# Altium schematic symbol library 13-Analog D 数模模数.SchLib: 573 symbols (part 6 of 6) (continued)
## TPS-1 (continued)
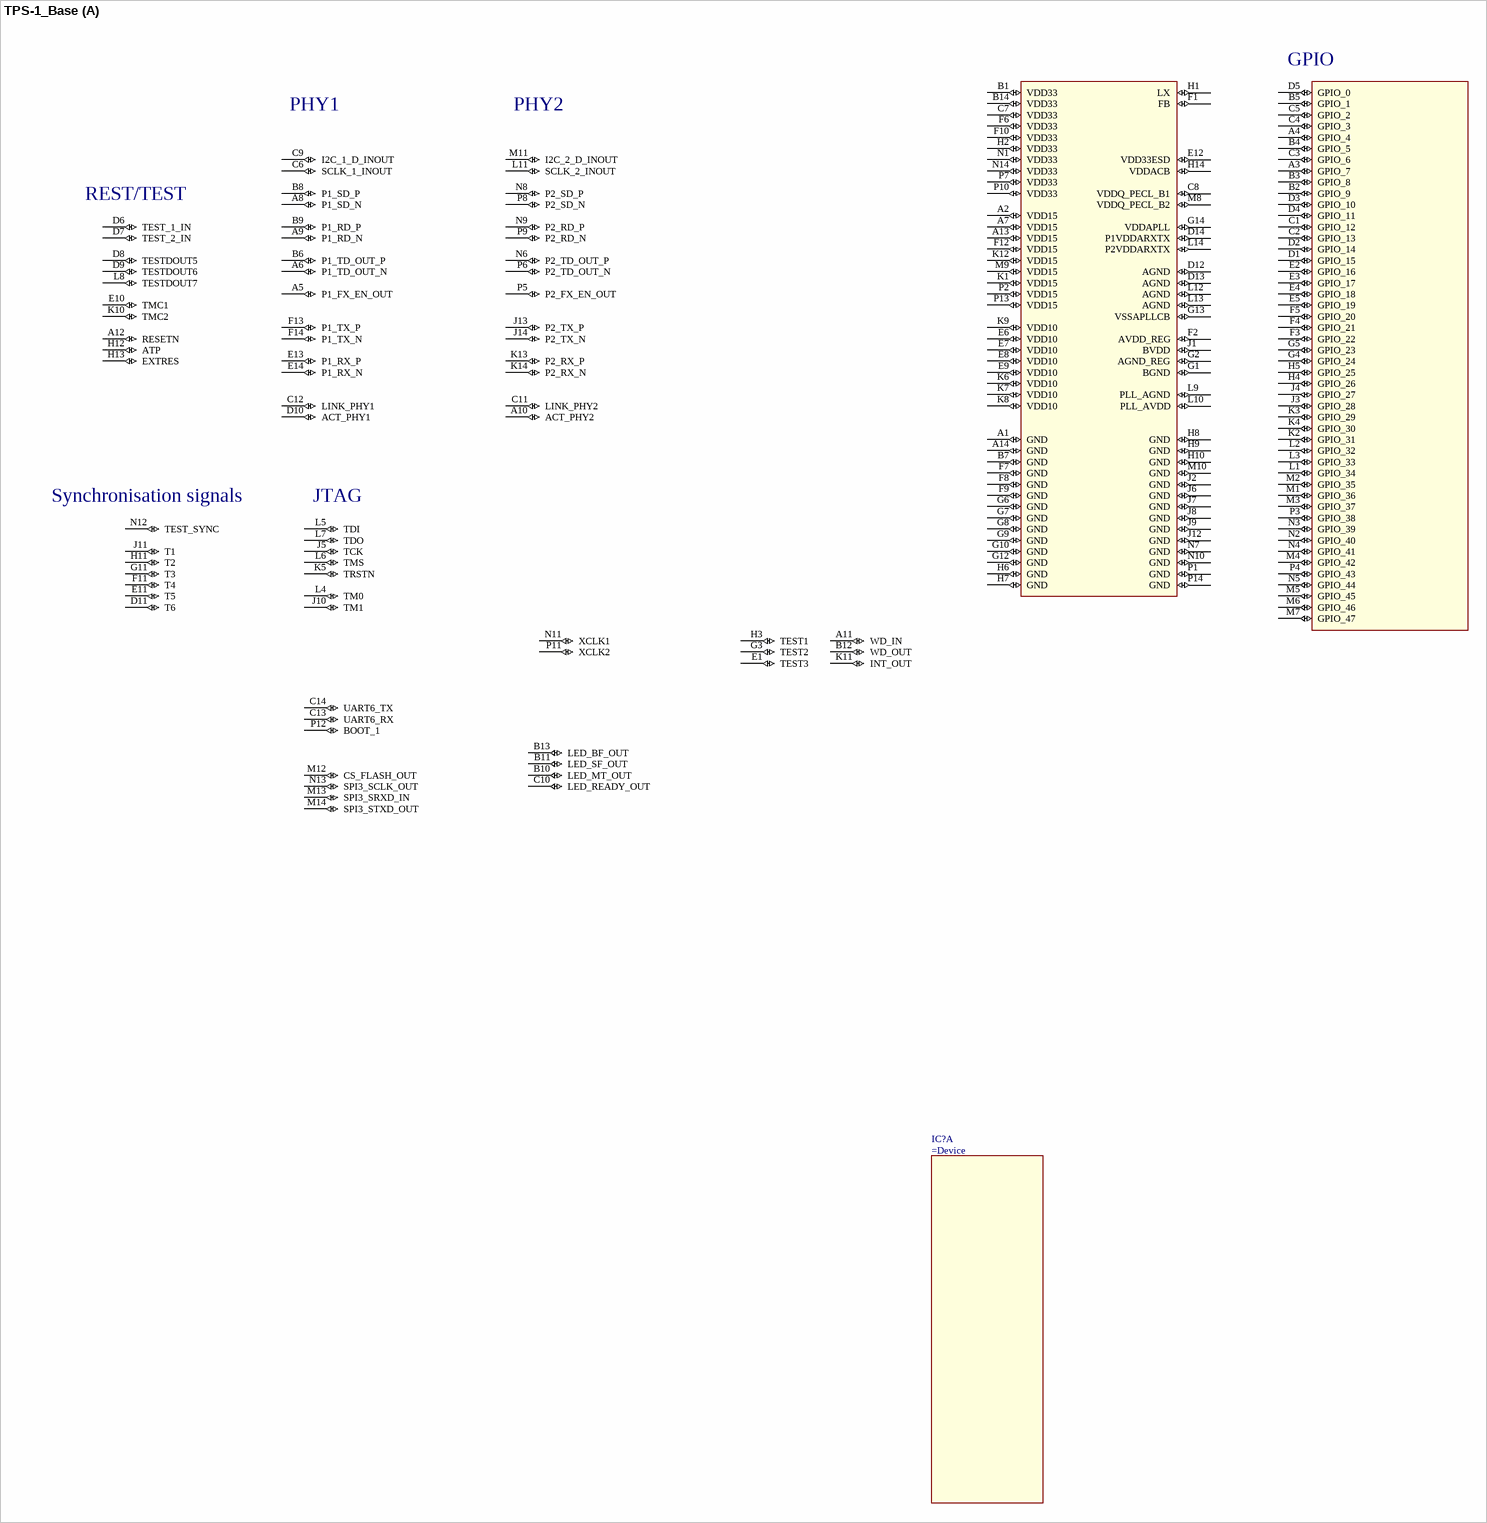
[diagram p38: symbol TPS-1_Base]

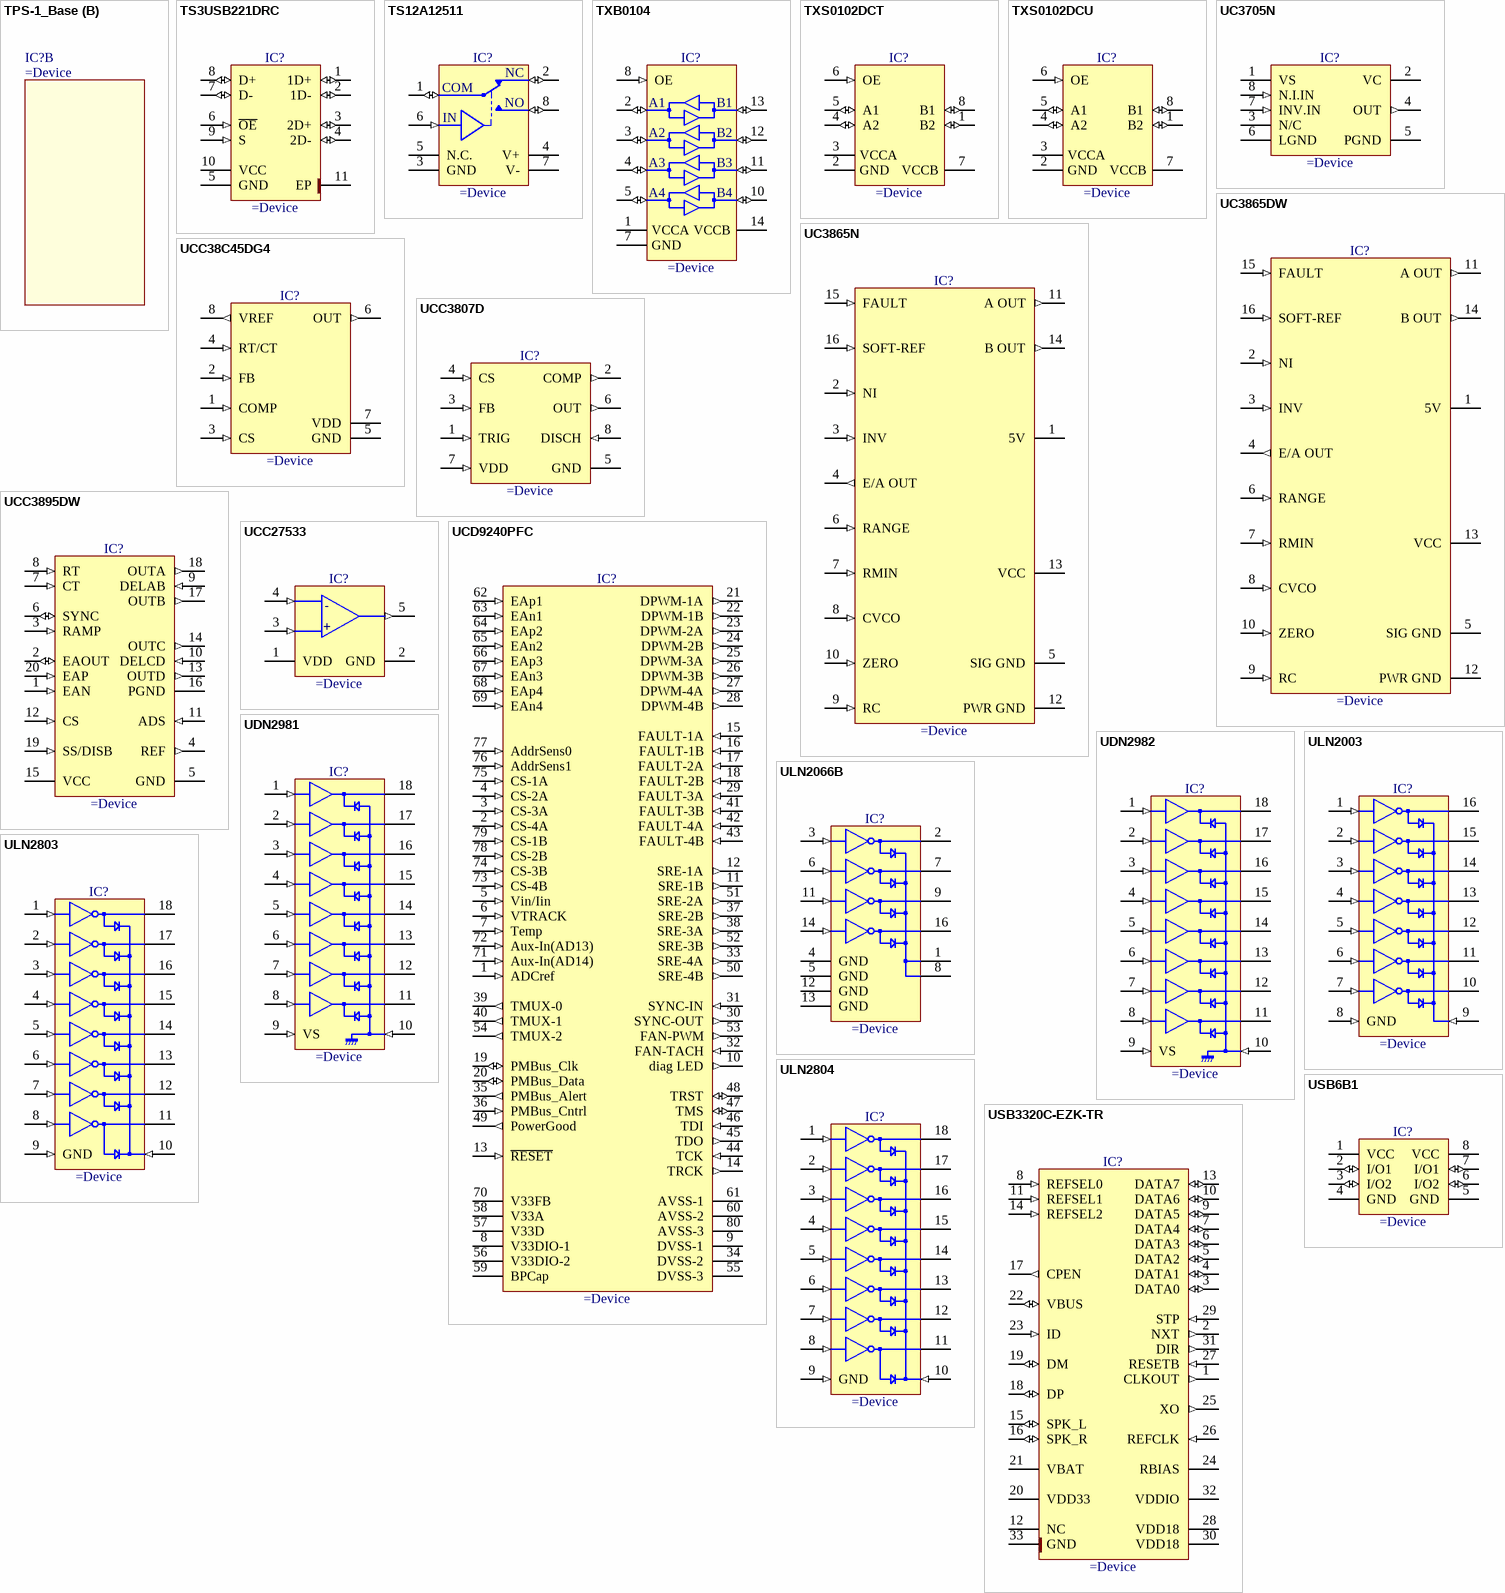
[diagram p39: symbols TPS-1_Base to USB3320C-EZK-TR]

## TPS-1_Base
designator IC?
Single Chip Interface Solution for PROFINET IO Devices
part A pins: A1 GND (io), A2 VDD15 (io), A3 GPIO_7 (io), A4 GPIO_4 (io), A5 P1_FX_EN_OUT (io), A6 P1_TD_OUT_N (io), A7 VDD15 (io), A8 P1_SD_N (io), A9 P1_RD_N (io), A10 ACT_PHY2 (io), A11 WD_IN (io), A12 RESETN (io), A13 VDD15 (io), A14 GND (io), B1 VDD33 (io), B2 GPIO_9 (io), B3 GPIO_8 (io), B4 GPIO_5 (io), B5 GPIO_1 (io), B6 P1_TD_OUT_P (io), B7 GND (io), B8 P1_SD_P (io), B9 P1_RD_P (io), B10 LED_MT_OUT (io), B11 LED_SF_OUT (io), B12 WD_OUT (io), B13 LED_BF_OUT (io), B14 VDD33 (io), C1 GPIO_12 (io), C2 GPIO_13 (io), C3 GPIO_6 (io), C4 GPIO_3 (io), C5 GPIO_2 (io), C6 SCLK_1_INOUT (io), C7 VDD33 (io), C8 VDDQ_PECL_B1 (io), C9 I2C_1_D_INOUT (io), C10 LED_READY_OUT (io), C11 LINK_PHY2 (io), C12 LINK_PHY1 (io), C13 UART6_RX (io), C14 UART6_TX (io), D1 GPIO_15 (io), D2 GPIO_14 (io), D3 GPIO_10 (io), D4 GPIO_11 (io), D5 GPIO_0 (io), D6 TEST_1_IN (io), D7 TEST_2_IN (io), D8 TESTDOUT5 (io), D9 TESTDOUT6 (io), D10 ACT_PHY1 (io), D11 T6 (io), D12 AGND (io), D13 AGND (io), D14 P1VDDARXTX (io), E1 TEST3 (io), E2 GPIO_16 (io), E3 GPIO_17 (io), E4 GPIO_18 (io), E5 GPIO_19 (io), E6 VDD10 (io), E7 VDD10 (io), E8 VDD10 (io), E9 VDD10 (io), E10 TMC1 (io), E11 T5 (io), E12 VDD33ESD (io), E13 P1_RX_P (io), E14 P1_RX_N (io), F1 FB (io), F2 AVDD_REG (io), F3 GPIO_22 (io), F4 GPIO_21 (io), F5 GPIO_20 (io), F6 VDD33 (io), F7 GND (io), F8 GND (io), F9 GND (io), F10 VDD33 (io), F11 T4 (io), F12 VDD15 (io), F13 P1_TX_P (io), F14 P1_TX_N (io), G1 BGND (io), G2 AGND_REG (io), G3 TEST2 (io), G4 GPIO_24 (io), G5 GPIO_23 (io), G6 GND (io), G7 GND (io), G8 GND (io), G9 GND (io), G10 GND (io), G11 T3 (io), G12 GND (io), G13 VSSAPLLCB (io), G14 VDDAPLL (io), H1 LX (io), H2 VDD33 (io), H3 TEST1 (io), H4 GPIO_26 (io), H5 GPIO_25 (io), H6 GND (io), H7 GND (io), H8 GND (io), H9 GND (io), H10 GND (io), H11 T2 (io), H12 ATP (io), H13 EXTRES (io), H14 VDDACB (io), J1 BVDD (io), J2 GND (io), J3 GPIO_28 (io), J4 GPIO_27 (io), J5 TCK (io), J6 GND (io), J7 GND (io), J8 GND (io), J9 GND (io), J10 TM1 (io), J11 T1 (io), J12 GND (io), J13 P2_TX_P (io), J14 P2_TX_N (io), K1 VDD15 (io), K2 GPIO_31 (io), K3 GPIO_29 (io), K4 GPIO_30 (io), K5 TRSTN (io), K6 VDD10 (io), K7 VDD10 (io), K8 VDD10 (io), K9 VDD10 (io), K10 TMC2 (io), K11 INT_OUT (io), K12 VDD15 (io), K13 P2_RX_P (io), K14 P2_RX_N (io), L1 GPIO_34 (io), L2 GPIO_32 (io), L3 GPIO_33 (io), L4 TM0 (io), L5 TDI (io), L6 TMS (io), L7 TDO (io), L8 TESTDOUT7 (io), L9 PLL_AGND (io), L10 PLL_AVDD (io), L11 SCLK_2_INOUT (io), L12 AGND (io), L13 AGND (io), L14 P2VDDARXTX (io), M1 GPIO_36 (io), M2 GPIO_35 (io), M3 GPIO_37 (io), M4 GPIO_42 (io), M5 GPIO_45 (io), M6 GPIO_46 (io), M7 GPIO_47 (io), M8 VDDQ_PECL_B2 (io), M9 VDD15 (io), M10 GND (io), M11 I2C_2_D_INOUT (io), M12 CS_FLASH_OUT (io), M13 SPI3_SRXD_IN (io), M14 SPI3_STXD_OUT (io), N1 VDD33 (io), N2 GPIO_40 (io), N3 GPIO_39 (io), N4 GPIO_41 (io), N5 GPIO_44 (io), N6 P2_TD_OUT_P (io), N7 GND (io), N8 P2_SD_P (io), N9 P2_RD_P (io), N10 GND (io), N11 XCLK1 (io), N12 TEST_SYNC (io), N13 SPI3_SCLK_OUT (io), N14 VDD33 (io), P1 GND (io), P2 VDD15 (io), P3 GPIO_38 (io), P4 GPIO_43 (io), P5 P2_FX_EN_OUT (io), P6 P2_TD_OUT_N (io), P7 VDD33 (io), P8 P2_SD_N (io), P9 P2_RD_N (io), P10 VDD33 (io), P11 XCLK2 (io), P12 BOOT_1 (io), P13 VDD15 (io), P14 GND (io)
part A text: GPIO; PHY1; PHY2; REST/TEST; Synchronisation signals; JTAG

## TS3USB221DRC
designator IC?
High-Speed USB 2.0 (480-Mbps) 1:2 Multiplexer/Demultiplexer Switch With Single Enable
pins: 1 1D+ (io), 2 1D- (io), 3 2D+ (io), 4 2D- (io), 5 GND (power), 6 ~{OE} (in), 7 D- (io), 8 D+ (io), 9 S (in), 10 VCC (power), 11 EP (power)

## TS12A12511
designator IC?
±6V/+12V, 5 Ohm, Low Ron Single SPDT CMOS Analog Switch
pins: 1 S (io), 2 NC (io), 3 GND (power), 4 V+ (power), 5 N.C. (power), 6 IN (in), 7 V- (power), 8 NO (io)
text: COM

## TXB0104
designator IC?
4-Bit Bidirectionnal Voltage-Level Translator
pins: 1 Vcca (power) "A-port supply voltage", 2 A1 (io) "Input/output 1", 3 A2 (io) "Input/output 2", 4 A3 (io) "Input/output 3", 5 A4 (io) "Input/output 4", 7 GND (power) "Ground", 8 OE (in) "3-state output-mode enable", 10 B4 (io) "Input/output 4", 11 B3 (io) "Input/output 3", 12 B2 (io) "Input/output 2", 13 B1 (io) "Input/output 1", 14 Vccb (power) "B-port supply voltage"
text: VCCA; VCCB

## TXS0102DCT
designator IC?
2-Bit Bidirectionnal Voltage-Level Translator for Open-Drain And Push-Pull Applications
pins: 1 B2 (io) "Input/output 2", 2 GND (power) "Ground", 3 Vcca (power) "A-port supply voltage", 4 A2 (io) "Input/output 2", 5 A1 (io) "Input/output 1", 6 OE (in) "3-state output-mode enable", 7 Vccb (power) "B-port supply voltage", 8 B1 (io) "Input/output 1"
text: VCCA; VCCB

## TXS0102DCU
designator IC?
2-Bit Bidirectionnal Voltage-Level Translator for Open-Drain And Push-Pull Applications
pins: 1 B2 (io) "Input/output 2", 2 GND (power) "Ground", 3 Vcca (power) "A-port supply voltage", 4 A2 (io) "Input/output 2", 5 A1 (io) "Input/output 1", 6 OE (in) "3-state output-mode enable", 7 Vccb (power) "B-port supply voltage", 8 B1 (io) "Input/output 1"
text: VCCA; VCCB

## UC3705N
designator IC?
5V to 40V, 1.5A Source/Sink Drive, Complementary High Speed Power Driver
pins: 1 VS (power), 2 VC (power), 3 N/C, 4 OUT (out), 5 PGND (power), 6 LGND (power), 7 INV.IN (in), 8 N.I.IN (in)

## UC3865DW
designator IC?
Resonant-Mode Power Supply Controller
pins: 1 5V (power), 2 NI (in), 3 INV (in), 4 E/A OUT (out), 5 SIG GND (power), 6 RANGE (in), 7 RMIN (in), 8 CVCO (in), 9 RC (in), 10 ZERO (in), 11 A OUT (out), 12 PWR GND (power), 13 VCC (power), 14 B OUT (out), 15 FAULT (in), 16 SOFT-REF (in)

## UC3865N
designator IC?
Resonant-Mode Power Supply Controller
pins: 1 5V (power), 2 NI (in), 3 INV (in), 4 E/A OUT (out), 5 SIG GND (power), 6 RANGE (in), 7 RMIN (in), 8 CVCO (in), 9 RC (in), 10 ZERO (in), 11 A OUT (out), 12 PWR GND (power), 13 VCC (power), 14 B OUT (out), 15 FAULT (in), 16 SOFT-REF (in)

## UCC38C45DG4
designator IC?
BiCMOS Low-Power Current-Mode PWM Controller
pins: 1 COMP (in), 2 FB (in), 3 CS (in), 4 RT/CT (in), 5 GND (power), 6 OUT (out), 7 VDD (power), 8 VREF (out)

## UCC3807D
designator IC?
Programmable Maximum Duty Cycle PWM Controller
pins: 1 TRIG (in), 2 COMP (out), 3 FB (in), 4 CS (in), 5 GND (power), 6 OUT (out), 7 VDD (in), 8 DISCH (in)

## UCC3895DW
designator IC?
BiCMOS Advenced Phase-Shift PWM Controller
pins: 1 EAN (in), 2 EAOUT (io), 3 RAMP (in), 4 REF (out), 5 GND (power), 6 SYNC (io), 7 CT (in), 8 RT (in), 9 DELAB (in), 10 DELCD (in), 11 ADS (in), 12 CS (in), 13 OUTD (out), 14 OUTC (out), 15 VCC (power), 16 PGND (power), 17 OUTB (out), 18 OUTA (out), 19 SS/DISB (in), 20 EAP (in)

## UCC27533
designator IC?
2.5A and 5A, 35Vmax VDD FET and IGBT Single-Gate Driver
pins: 1 VDD (power), 2 GND (power), 3 IN+ (in), 4 IN- (in), 5 OUT (out)
text: -; +

## UCD9240PFC
designator IC?
Digital PWM System Controller
pins: 1 ADCref (in), 2 CS-4A (in), 3 CS-3A (in), 4 CS-2A (in), 5 Vin/Iin (in), 6 VTRACK (in), 7 Temp (in), 8 V33DIO-1 (power), 9 DVSS-1 (power), 10 diag LED (out), 11 SRE-1B (out), 12 SRE-1A (out), 13 ~{RESET} (in), 14 TRCK (out), 15 FAULT-1A (in), 16 FAULT-1B (in), 17 FAULT-2A (in), 18 FAULT-2B (in), 19 PMBus_Clk (io), 20 PMBus_Data (io), 21 DPWM-1A (out), 22 DPWM-1B (out), 23 DPWM-2A (out), 24 DPWM-2B (out), 25 DPWM-3A (out), 26 DPWM-3B (out), 27 DPWM-4A (out), 28 DPWM-4B (out), 29 FAULT-3A (in), 30 SYNC-OUT (out), 31 SYNC-IN (in), 32 FAN-TACH (in), 33 SRE-4A (out), 34 DVSS-2 (power), 35 PMBus_Alert (out), 36 PMBus_Cntrl (in), 37 SRE-2B (out), 38 SRE-3A (out), 39 TMUX-0 (out), 40 TMUX-1 (out), 41 FAULT-3B (in), 42 FAULT-4A (in), 43 FAULT-4B (in), 44 TCK (in), 45 TDO (out), 46 TDI (in), 47 TMS (io), 48 TRST (io), 49 PowerGood (out), 50 SRE-4B (out), 51 SRE-2A (out), 52 SRE-3B (out), 53 FAN-PWM (out), 54 TMUX-2 (out), 55 DVSS-3 (power), 56 V33DIO-2 (power), 57 V33D (power), 58 V33A (power), 59 BPCap (power), 60 AVSS-2 (power), 61 AVSS-1 (power), 62 EAp1 (in), 63 EAn1 (in), 64 EAp2 (in), 65 EAn2 (in), 66 EAp3 (in), 67 EAn3 (in), 68 EAp4 (in), 69 EAn4 (in), 70 V33FB (power), 71 Aux-In(AD14) (in), 72 Aux-In(AD13) (in), 73 CS-4B (in), 74 CS-3B (in), 75 CS-1A (in), 76 AddrSens1 (in), 77 AddrSens0 (in), 78 CS-2B (in), 79 CS-1B (in), 80 AVSS-3 (power)

## UDN2981
designator IC?
8-Channel Source Drivers
pins: 1 I1 (in), 2 I2 (in), 3 I3 (in), 4 I4 (in), 5 I5 (in), 6 I6 (in), 7 I7 (in), 8 I8 (in), 9 VS (in), 10 COM (in), 11 O8 (oc), 12 O7 (oc), 13 O6 (oc), 14 O5 (oc), 15 O4 (oc), 16 O3 (oc), 17 O2 (oc), 18 O1 (oc)

## UDN2982
designator IC?
8-Channel Source Drivers
pins: 1 I1 (in), 2 I2 (in), 3 I3 (in), 4 I4 (in), 5 I5 (in), 6 I6 (in), 7 I7 (in), 8 I8 (in), 9 VS (in), 10 COM (in), 11 O8 (oc), 12 O7 (oc), 13 O6 (oc), 14 O5 (oc), 15 O4 (oc), 16 O3 (oc), 17 O2 (oc), 18 O1 (oc)

## ULN2003
designator IC?
Seven darlington array
pins: 1 IN1 (in), 2 IN2 (in), 3 IN3 (in), 4 IN4 (in), 5 IN5 (in), 6 IN6 (in), 7 IN7 (in), 8 GND (in), 9 COM (in), 10 OUT7 (oc), 11 OUT6 (oc), 12 OUT5 (oc), 13 OUT4 (oc), 14 OUT3 (oc), 15 OUT2 (oc), 16 OUT1 (oc)

## ULN2066B
designator IC?
Quad Darlington Switches
pins: 1 K, 2 C1 (oc), 3 B1 (in), 4 GND (power), 5 GND (power), 6 B2 (in), 7 C2 (oc), 8 K, 9 C3 (oc), 11 B3 (in), 12 GND (power), 13 GND (power), 14 B4 (in), 16 C4 (oc)

## ULN2803
designator IC?
High-Voltage High-Current Darlington Array
pins: 1 I1 (in), 2 I2 (in), 3 I3 (in), 4 I4 (in), 5 I5 (in), 6 I6 (in), 7 I7 (in), 8 I8 (in), 9 GND (in), 10 COM (in), 11 O8 (oc), 12 O7 (oc), 13 O6 (oc), 14 O5 (oc), 15 O4 (oc), 16 O3 (oc), 17 O2 (oc), 18 O1 (oc)

## ULN2804
designator IC?
High-Voltage High-Current Darlington Array
pins: 1 I1 (in), 2 I2 (in), 3 I3 (in), 4 I4 (in), 5 I5 (in), 6 I6 (in), 7 I7 (in), 8 I8 (in), 9 GND (in), 10 COM (in), 11 O8 (oc), 12 O7 (oc), 13 O6 (oc), 14 O5 (oc), 15 O4 (oc), 16 O3 (oc), 17 O2 (oc), 18 O1 (oc)

## USB6B1
designator IC?
Data Lines Protection, 2-Input Line Filter + ESD + Vbus, SO-8
pins: 1 VCC (power) "Supply", 2 I/O1 (io) "Input/Output 1", 3 I/O2 (io) "Input/Output 2", 4 GND (power) "Ground", 5 GND (power) "Ground", 6 I/O2 (io) "Input/Output 2", 7 I/O1 (io) "Input/Output 1", 8 VCC (power) "Supply"

## USB3320C-EZK-TR
designator IC?
Highly Integrated, Full Featured Hi-Speed USB 2.0 ULPI Transceiver
pins: 1 CLKOUT (out), 2 NXT (out), 3 DATA0 (io), 4 DATA1 (io), 5 DATA2 (io), 6 DATA3 (io), 7 DATA4 (io), 8 REFSEL0 (in), 9 DATA5 (io), 10 DATA6 (io), 11 REFSEL1 (in), 12 NC, 13 DATA7 (io), 14 REFSEL2 (in), 15 SPK_L (io), 16 SPK_R (io), 17 CPEN (out), 18 DP (io), 19 DM (io), 20 VDD33 (power), 21 VBAT (power), 22 VBUS (io), 23 ID (in), 24 RBIAS, 25 XO (out), 26 REFCLK (in), 27 RESETB (in), 28 VDD18 (power), 29 STP (in), 30 VDD18 (power), 31 DIR (out), 32 VDDIO (power), 33 GND (power)

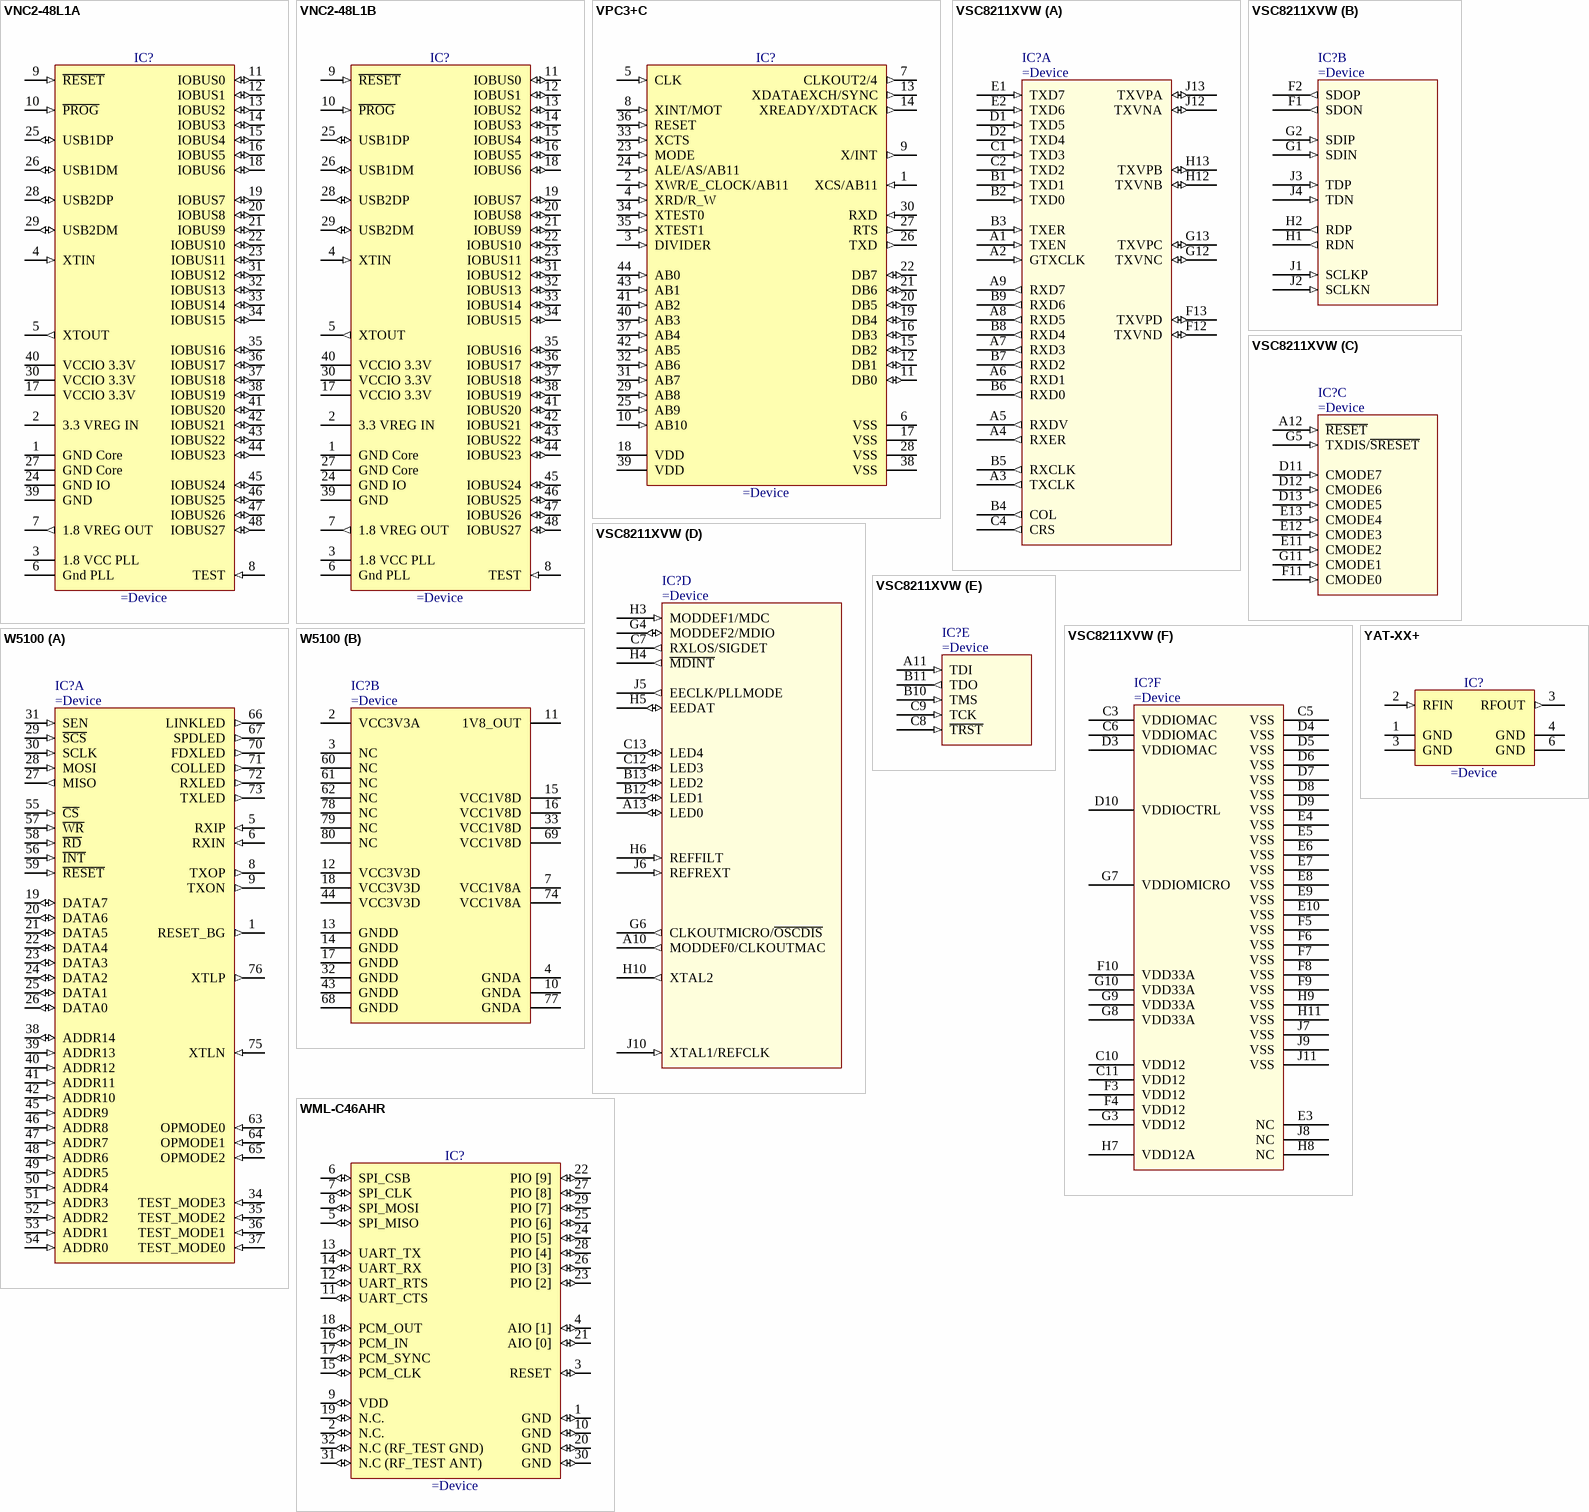
[diagram p40: symbols VNC2-48L1A to YAT-XX+]

## VNC2-48L1A
designator IC?
Vinculum-II Embedded Dual USB Host Controller
pins: 1 GND Core (power), 2 3.3 VREG IN (power), 3 1.8 VCC PLL (power), 4 XTIN (in), 5 XTOUT (out), 6 Gnd PLL (power), 7 1.8 VREG OUT (out), 8 TEST (in), 9 ~{RESET} (in), 10 ~{PROG} (in), 11 IOBUS0 (io), 12 IOBUS1 (io), 13 IOBUS2 (io), 14 IOBUS3 (io), 15 IOBUS4 (io), 16 IOBUS5 (io), 17 VCCIO 3.3V (power), 18 IOBUS6 (io), 19 IOBUS7 (io), 20 IOBUS8 (io), 21 IOBUS9 (io), 22 IOBUS10 (io), 23 IOBUS11 (io), 24 GND IO (power), 25 USB1DP (io), 26 USB1DM (io), 27 GND Core (power), 28 USB2DP (io), 29 USB2DM (io), 30 VCCIO 3.3V (power), 31 IOBUS12 (io), 32 IOBUS13 (io), 33 IOBUS14 (io), 34 IOBUS15 (io), 35 IOBUS16 (io), 36 IOBUS17 (io), 37 IOBUS18 (io), 38 IOBUS19 (io), 39 GND (power), 40 VCCIO 3.3V (power), 41 IOBUS20 (io), 42 IOBUS21 (io), 43 IOBUS22 (io), 44 IOBUS23 (io), 45 IOBUS24 (io), 46 IOBUS25 (io), 47 IOBUS26 (io), 48 IOBUS27 (io)

## VNC2-48L1B
designator IC?
Vinculum-II Embedded Dual USB Host Controller
pins: 1 GND Core (power), 2 3.3 VREG IN (power), 3 1.8 VCC PLL (power), 4 XTIN (in), 5 XTOUT (out), 6 Gnd PLL (power), 7 1.8 VREG OUT (out), 8 TEST (in), 9 ~{RESET} (in), 10 ~{PROG} (in), 11 IOBUS0 (io), 12 IOBUS1 (io), 13 IOBUS2 (io), 14 IOBUS3 (io), 15 IOBUS4 (io), 16 IOBUS5 (io), 17 VCCIO 3.3V (power), 18 IOBUS6 (io), 19 IOBUS7 (io), 20 IOBUS8 (io), 21 IOBUS9 (io), 22 IOBUS10 (io), 23 IOBUS11 (io), 24 GND IO (power), 25 USB1DP (io), 26 USB1DM (io), 27 GND Core (power), 28 USB2DP (io), 29 USB2DM (io), 30 VCCIO 3.3V (power), 31 IOBUS12 (io), 32 IOBUS13 (io), 33 IOBUS14 (io), 34 IOBUS15 (io), 35 IOBUS16 (io), 36 IOBUS17 (io), 37 IOBUS18 (io), 38 IOBUS19 (io), 39 GND (power), 40 VCCIO 3.3V (power), 41 IOBUS20 (io), 42 IOBUS21 (io), 43 IOBUS22 (io), 44 IOBUS23 (io), 45 IOBUS24 (io), 46 IOBUS25 (io), 47 IOBUS26 (io), 48 IOBUS27 (io)

## VPC3+C
designator IC?
PROFIBUS-DP Slave Controller
pins: 1 XCS/AB11 (in), 2 XWR/E_CLOCK/AB11 (in), 3 DIVIDER (in), 4 XRD/R_W (in), 5 CLK (in), 6 VSS (power), 7 CLKOUT2/4 (out), 8 XINT/MOT (in), 9 X/INT (out), 10 AB10 (in), 11 DB0 (io), 12 DB1 (io), 13 XDATAEXCH/SYNC (out), 14 XREADY/XDTACK (out), 15 DB2 (io), 16 DB3 (io), 17 VSS (power), 18 VDD (power), 19 DB4 (io), 20 DB5 (io), 21 DB6 (io), 22 DB7 (io), 23 MODE (in), 24 ALE/AS/AB11 (in), 25 AB9 (in), 26 TXD (out), 27 RTS (out), 28 VSS (power), 29 AB8 (in), 30 RXD (in), 31 AB7 (in), 32 AB6 (in), 33 XCTS (in), 34 XTEST0 (in), 35 XTEST1 (in), 36 RESET (in), 37 AB4 (in), 38 VSS (power), 39 VDD (power), 40 AB3 (in), 41 AB2 (in), 42 AB5 (in), 43 AB1 (in), 44 AB0 (in)

## VSC8211XVW
designator IC?
Single Port 10/100/1000BASE-T PHY and 1000BASE-X PHY with SGMII, SerDes, GMII, MII, TBI, RGMII / RTBI MAC Interfaces
part A pins: A1 TXEN (in), A2 GTXCLK (in), A3 TXCLK (out), A4 RXER (out), A5 RXDV (out), A6 RXD1 (out), A7 RXD3 (out), A8 RXD5 (out), A9 RXD7 (out), B1 TXD1 (in), B2 TXD0 (in), B3 TXER (in), B4 COL (out), B5 RXCLK (out), B6 RXD0 (out), B7 RXD2 (out), B8 RXD4 (out), B9 RXD6 (out), C1 TXD3 (in), C2 TXD2 (in), C4 CRS (out), D1 TXD5 (in), D2 TXD4 (in), E1 TXD7 (in), E2 TXD6 (in), F12 TXVND (io), F13 TXVPD (io), G12 TXVNC (io), G13 TXVPC (io), H12 TXVNB (io), H13 TXVPB (io), J12 TXVNA (io), J13 TXVPA (io)
part B pins: F1 SDON (out), F2 SDOP (out), G1 SDIN (in), G2 SDIP (in), H1 RDN (out), H2 RDP (out), J1 SCLKP (in), J2 SCLKN (in), J3 TDP (in), J4 TDN (in)
part C pins: A12 ~{RESET} (in), D11 CMODE7 (in), D12 CMODE6 (in), D13 CMODE5 (in), E11 CMODE2 (in), E12 CMODE3 (in), E13 CMODE4 (in), F11 CMODE0 (in), G5 TXDIS/~{SRESET} (in), G11 CMODE1 (in)
part D pins: A10 MODDEF0/CLKOUTMAC (out), A13 LED0 (io), B12 LED1 (io), B13 LED2 (io), C7 RXLOS/SIGDET (out), C12 LED3 (io), C13 LED4 (io), G4 MODDEF2/MDIO (io), G6 CLKOUTMICRO/~{OSCDIS} (out), H3 MODDEF1/MDC (in), H4 ~{MDINT} (out), H5 EEDAT (io), H6 REFFILT (in), H10 XTAL2 (out), J5 EECLK/PLLMODE (out), J6 REFREXT (in), J10 XTAL1/REFCLK (in)
part E pins: A11 TDI (in), B10 TMS (in), B11 TDO (out), C8 ~{TRST} (in), C9 TCK (in)
part F pins: C3 VDDIOMAC, C5 VSS, C6 VDDIOMAC, C10 VDD12, C11 VDD12, D3 VDDIOMAC, D4 VSS, D5 VSS, D6 VSS, D7 VSS, D8 VSS, D9 VSS, D10 VDDIOCTRL, E3 NC, E4 VSS, E5 VSS, E6 VSS, E7 VSS, E8 VSS, E9 VSS, E10 VSS, F3 VDD12, F4 VDD12, F5 VSS, F6 VSS, F7 VSS, F8 VSS, F9 VSS, F10 VDD33A, G3 VDD12, G7 VDDIOMICRO, G8 VDD33A, G9 VDD33A, G10 VDD33A, H7 VDD12A, H8 NC, H9 VSS, H11 VSS, J7 VSS, J8 NC, J9 VSS, J11 VSS

## W5100
designator IC?
iEthernet W5200 Fast SPI Ethernet Controller
part A pins: 1 RESET_BG (out), 5 RXIP (in), 6 RXIN (in), 8 TXOP (out), 9 TXON (out), 19 DATA7 (io), 20 DATA6 (io), 21 DATA5 (io), 22 DATA4 (io), 23 DATA3 (io), 24 DATA2 (io), 25 DATA1 (io), 26 DATA0 (io), 27 MISO (out), 28 MOSI (in), 29 ~{SCS} (in), 30 SCLK (in), 31 SEN (in), 34 TEST_MODE3 (in), 35 TEST_MODE2 (in), 36 TEST_MODE1 (in), 37 TEST_MODE0 (in), 38 ADDR14 (io), 39 ADDR13 (in), 40 ADDR12 (in), 41 ADDR11 (in), 42 ADDR10 (in), 45 ADDR9 (in), 46 ADDR8 (in), 47 ADDR7 (in), 48 ADDR6 (in), 49 ADDR5 (in), 50 ADDR4 (in), 51 ADDR3 (in), 52 ADDR2 (in), 53 ADDR1 (in), 54 ADDR0 (in), 55 ~{CS} (in), 56 ~{INT} (in), 57 ~{WR} (in), 58 ~{RD} (in), 59 ~{RESET} (in), 63 OPMODE0 (in), 64 OPMODE1 (in), 65 OPMODE2 (in), 66 LINKLED (out), 67 SPDLED (out), 70 FDXLED (out), 71 COLLED (out), 72 RXLED (out), 73 TXLED (out), 75 XTLN (in), 76 XTLP (out)
part B pins: 2 VCC3V3A (power), 3 NC, 4 GNDA (power), 7 VCC1V8A (power), 10 GNDA (power), 11 1V8_OUT (power), 12 VCC3V3D (power), 13 GNDD (power), 14 GNDD (power), 15 VCC1V8D (power), 16 VCC1V8D (power), 17 GNDD (power), 18 VCC3V3D (power), 32 GNDD (power), 33 VCC1V8D (power), 43 GNDD (power), 44 VCC3V3D (power), 60 NC, 61 NC, 62 NC, 68 GNDD (power), 69 VCC1V8D (power), 74 VCC1V8A (power), 77 GNDA (power), 78 NC, 79 NC, 80 NC

## WML-C46AHR
designator IC?
Bluetooth Wireless Communications Module
pins: 1 GND (io), 2 N.C. (io), 3 RESET (io), 4 AIO [1] (io), 5 SPI_MISO (io), 6 SPI_CSB (io), 7 SPI_CLK (io), 8 SPI_MOSI (io), 9 VDD (io), 10 GND (io), 11 UART_CTS (io), 12 UART_RTS (io), 13 UART_TX (io), 14 UART_RX (io), 15 PCM_CLK (io), 16 PCM_IN (io), 17 PCM_SYNC (io), 18 PCM_OUT (io), 19 N.C. (io), 20 GND (io), 21 AIO [0] (io), 22 PIO [9] (io), 23 PIO [2] (io), 24 PIO [5] (io), 25 PIO [6] (io), 26 PIO [3] (io), 27 PIO [8] (io), 28 PIO [4] (io), 29 PIO [7] (io), 30 GND (io), 31 N.C (RF_TEST ANT) (io), 32 N.C (RF_TEST GND) (io)

## YAT-XX+
designator IC?
DC to 18GHz, 2W, 50 Ohm, 4dB Attenuator
pins: 1 GND (power), 2 RFIN (in), 3 RFOUT (out), 3 GND (power), 4 GND (power), 6 GND (power)